# Altium footprint library RPSLib.PcbLib: 116 footprints (part 3 of 8)
Each footprint in its own frame and in the unit in brackets; x right, y up, seen from the top. Pads: shape width x height; smd on the part's side, far side on the other; paste and mask are expansions set on the pad; w line width, h text height; cw(c..) or ccw(c..) is an arc to the next point about the centre after c.
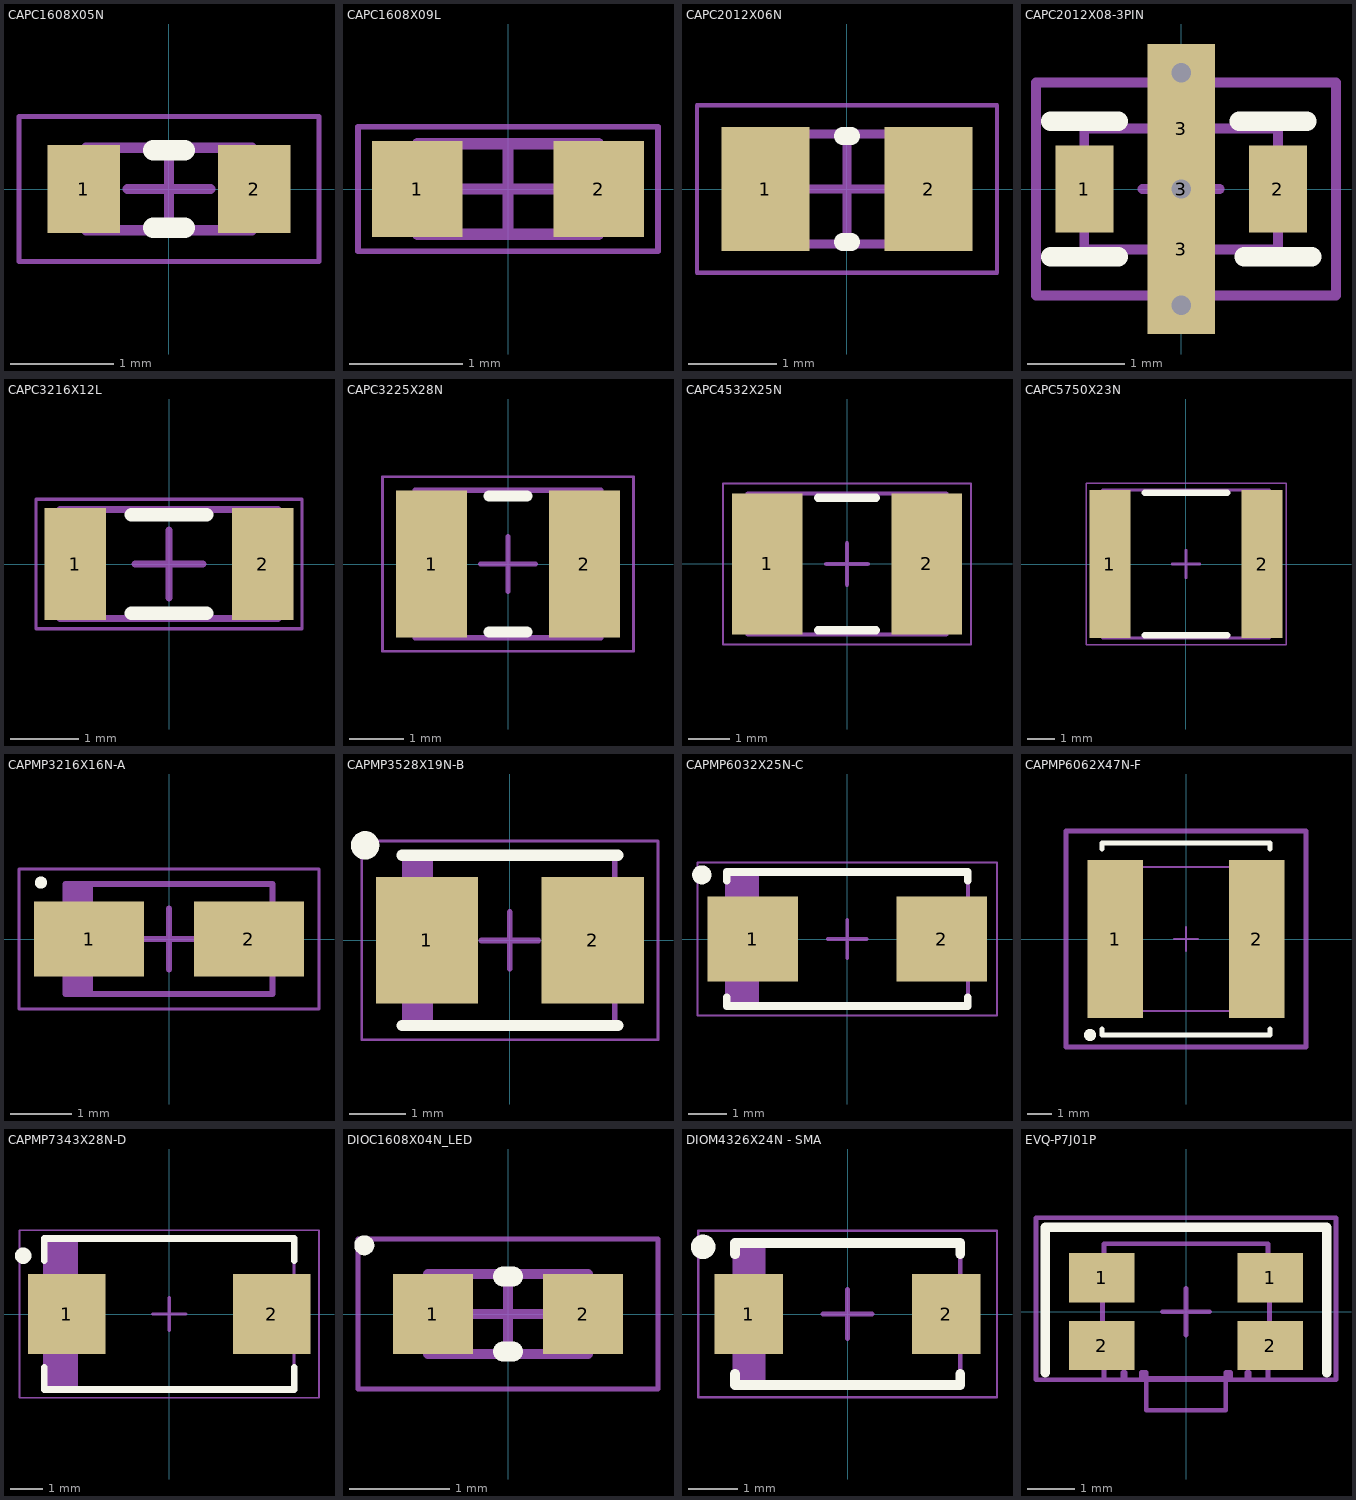
[diagram p2: the footprints below, top view; thin cyan lines are the x and y axes]

## CAPC1608X05N [mm] "Chip Capacitor, 2-Leads, Body 1.60x0.80mm, IPC Medium Density"
height 0.5
pads (2):
  rect 0.7x0.85 smd paste-0.05: 1(-0.825,0) 2(0.825,0)
Top Overlay:
  lines w0.2: -0.15,-0.375 0.15,-0.375 ; -0.15,0.375 0.15,0.375
Mechanical 13:
  lines w0.1: -0.8,-0.4 0.8,-0.4 0.8,0.4 -0.8,0.4 -0.8,-0.4
Mechanical 15:
  lines w0.05: -1.45,-0.7 -1.45,0.7 1.45,0.7 1.45,-0.7 -1.45,-0.7
  lines w0.1: -0.4,0 0.4,0 ; 0,-0.4 0,0.4
3D body "CAPC1608X05N.step": height 0.5, standoff 0, extent -0.8,-0.4 0.8,0.4

## CAPC1608X09L [mm] "Chip Capacitor, 2-Leads, Body 1.60x0.80mm, IPC High Density"
height 0.9
pads (2):
  rect 0.8x0.85 smd paste-0.05 mask+0.07: 1(-0.8,0) 2(0.8,0)
Mechanical 13:
  lines w0.1: -0.8,-0.4 -0.8,0.4 0.8,0.4 0.8,-0.4 -0.8,-0.4
Mechanical 15:
  lines w0.05: -1.325,-0.55 -1.325,0.55 1.325,0.55 1.325,-0.55 -1.325,-0.55
  lines w0.1: -0.4,0 0.4,0 ; 0,-0.4 0,0.4
3D body "CAPC1608X09L.step": height 0.9, standoff 0, extent -0.8,-0.4 0.8,0.4

## CAPC2012X06N [mm] "Chip Capacitor, 2-Leads, Body 2.00x1.25mm, IPC Medium Density"
height 0.6
pads (2):
  rect 1x1.4 smd: 1(-0.925,0) 2(0.925,0)
Top Overlay:
  lines w0.2: -0.05,-0.6 0.05,-0.6 ; -0.05,0.6 0.05,0.6
Mechanical 13:
  lines w0.1: -1,-0.625 1,-0.625 1,0.625 -1,0.625 -1,-0.625
Mechanical 15:
  lines w0.05: -1.7,-0.95 1.7,-0.95 1.7,0.95 -1.7,0.95 -1.7,-0.95
  lines w0.1: -0.5,0 0.5,0 ; 0,-0.5 0,0.5
3D body "CAPC2012X06N.step": height 0.6, standoff 0, extent -1,-0.625 1,0.625

## CAPC2012X08-3PIN [mm]
height 0.8
pads (5):
  rect 0.6x0.9 smd paste-0.02 mask+0.07: 1(-1,0) 2(1,0)
  rect 0.7x0.65 smd paste-0.02 mask+0.07: 3(0,-0.625) 3(0,0.625)
  rect 0.7x3 smd paste-1: 3(0,0)
via 0,0 diameter 0.4 hole 0.2
via 0,1.2 diameter 0.4 hole 0.2
via 0,-1.2 diameter 0.4 hole 0.2
Top Overlay:
  lines w0.2: -1.35,-0.7 -0.65,-0.7 ; -1.35,0.7 -0.65,0.7 ; 0.6,0.7 1.3,0.7 ; 0.65,-0.7 1.35,-0.7
Mechanical 13:
  lines w0.1: -1,-0.625 1,-0.625 1,0.625 -1,0.625 -1,-0.625
Mechanical 15:
  lines w0.1: -0.4,0 0.4,0 ; 0,-0.4 0,0.4 ; -1.5,-1.1 1.6,-1.1 1.6,1.1 -1.5,1.1 -1.5,-1.1
3D body "User Library-EMIFIL_0805.step": height 0.86, standoff 0.01, extent -1,-0.625 1,0.625

## CAPC3216X12L [mm] "Chip Capacitor, 2-Leads, Body 3.20x1.60mm, IPC High Density"
height 1.25
pads (2):
  rect 0.9x1.65 smd paste-0.05 mask+0.07: 1(-1.375,0) 2(1.375,0)
Top Overlay:
  lines w0.2: -0.55,-0.725 0.55,-0.725 ; -0.55,0.725 0.55,0.725
Mechanical 13:
  lines w0.1: -1.6,-0.8 -1.6,0.8 1.6,0.8 1.6,-0.8 -1.6,-0.8
Mechanical 15:
  lines w0.05: -1.95,-0.95 -1.95,0.95 1.95,0.95 1.95,-0.95 -1.95,-0.95
  lines w0.1: -0.5,0 0.5,0 ; 0,-0.5 0,0.5
3D body "CAPC3216X12L.step": height 1.25, standoff 0, extent -1.6,-0.8 1.6,0.8

## CAPC3225X28N [mm] "Chip Capacitor, 2-Leads, Body 3.20x2.50mm, IPC Medium Density"
height 2.79
pads (2):
  rect 1.3x2.7 smd: 1(-1.4,0) 2(1.4,0)
Top Overlay:
  lines w0.2: -0.35,-1.25 0.35,-1.25 ; -0.35,1.25 0.35,1.25
Mechanical 13:
  lines w0.1: -1.7,-1.35 -1.7,1.35 1.7,1.35 1.7,-1.35 -1.7,-1.35
Mechanical 15:
  lines w0.05: -2.3,-1.6 -2.3,1.6 2.3,1.6 2.3,-1.6 -2.3,-1.6
  lines w0.1: -0.5,0 0.5,0 ; 0,-0.5 0,0.5
3D body "CAPC3225X28N.step": height 2.79, standoff 0, extent -1.7,-1.35 1.7,1.35

## CAPC4532X25N [mm] "Chip Capacitor, 2-Leads, Body 4.50x3.20mm, IPC Medium Density"
height 2.54
pads (2):
  rect 1.7x3.4 smd paste-0.06 mask+0.07: 1(-1.925,0) 2(1.925,0)
Top Overlay:
  lines w0.2: -0.7,-1.6 0.7,-1.6 ; -0.7,1.6 0.7,1.6
Mechanical 13:
  lines w0.1: -2.4,-1.7 2.4,-1.7 2.4,1.7 -2.4,1.7 -2.4,-1.7
Mechanical 15:
  lines w0.05: -3,-1.95 3,-1.95 3,1.95 -3,1.95 -3,-1.95
  lines w0.1: -0.5,0 0.5,0 ; 0,-0.5 0,0.5
3D body "CAPC4532X25N.step": height 2.54, standoff 0, extent -2.4,-1.7 2.4,1.7

## CAPC5750X23N [mm] "Chip Capacitor, 2-Leads, Body 5.70x5.00mm, IPC Medium Density"
height 2.3
pads (2):
  rect 1.5x5.4 smd paste-0.05 mask+0.07: 1(-2.775,0) 2(2.775,0)
Top Overlay:
  lines w0.25: -1.5,-2.6 1.5,-2.6 ; -1.5,2.6 1.5,2.6
Mechanical 13:
  lines w0.1: -3.05,-2.7 3.05,-2.7 3.05,2.7 -3.05,2.7 -3.05,-2.7
Mechanical 15:
  lines w0.05: -3.65,-2.95 3.65,-2.95 3.65,2.95 -3.65,2.95 -3.65,-2.95
  lines w0.1: -0.5,0 0.5,0 ; 0,-0.5 0,0.5
3D body "CAPC5750X23N.step": height 2.3, standoff 0, extent -3.05,-2.7 3.05,2.7

## CAPMP3216X16N-A [mm] "Molded Capacitor, 2-Leads, Body 3.20x1.60mm, IPC Medium Density"
height 1.6
pads (2):
  rect 1.8x1.23 smd: 1(-1.31,0) 2(1.31,0)
Top Overlay:
  circle w0.1: c-2.1,0.925 r0.05
Mechanical 13:
  rectangle: -1.7,-0.9 -1.243,0.9
  lines w0.1: -1.7,-0.9 1.7,-0.9 1.7,0.9 -1.7,0.9 -1.7,-0.9
Mechanical 15:
  lines w0.05: -2.46,-1.15 -2.46,1.15 2.46,1.15 2.46,-1.15 -2.46,-1.15
  lines w0.1: -0.5,0 0.5,0 ; 0,-0.5 0,0.5
3D body "CAPMP3216X16N.step": height 1.6, standoff 0, extent -1.92,-0.9 1.92,0.9

## CAPMP3528X19N-B [mm] "Molded Capacitor, 2-Leads, Body 3.50x2.80mm, IPC Medium Density"
height 1.9
pads (2):
  rect 1.8x2.23 smd: 1(-1.46,0) 2(1.46,0)
Top Overlay:
  circle w0.25: c-2.55,1.675 r0.125
  lines w0.2: -1.9,-1.5 1.9,-1.5 ; -1.9,1.5 1.9,1.5
Mechanical 13:
  rectangle: -1.85,-1.5 -1.352,1.5
  lines w0.1: -1.85,-1.5 -1.85,1.5 1.85,1.5 1.85,-1.5 -1.85,-1.5
Mechanical 15:
  lines w0.05: -2.61,-1.75 2.61,-1.75 2.61,1.75 -2.61,1.75 -2.61,-1.75
  lines w0.1: -0.5,0 0.5,0 ; 0,-0.5 0,0.5
3D body "CAPMP3528X19N.step": height 1.9, standoff 0, extent -2.07,-1.5 2.07,1.5

## CAPMP6032X25N-C [mm] "Molded Capacitor, 2-Leads, Body 6.00x3.20mm, IPC Medium Density"
height 2.5
pads (2):
  rect 2.37x2.23 smd: 1(-2.47,0) 2(2.47,0)
Top Overlay:
  circle w0.25: c-3.8,1.675 r0.125
  lines w0.2: -3.15,-1.525 -3.15,-1.75 3.15,-1.75 3.15,-1.525 ; -3.15,1.525 -3.15,1.75 3.15,1.75 3.15,1.525
Mechanical 13:
  rectangle: -3.15,-1.75 -2.303,1.75
  lines w0.1: -3.15,-1.75 3.15,-1.75 3.15,1.75 -3.15,1.75 -3.15,-1.75
Mechanical 15:
  lines w0.05: -3.91,-2 -3.91,2 3.91,2 3.91,-2 -3.91,-2
  lines w0.1: -0.5,0 0.5,0 ; 0,-0.5 0,0.5
3D body "CAPMP6032X25N.step": height 2.5, standoff 0, extent -3.37,-1.75 3.37,1.75

## CAPMP6062X47N-F [mm] "Molded Capacitor, 2-Leads, Body 6.00x6.20mm, IPC Medium Density"
height 4.7
pads (2):
  rect 2.3x6.6 smd: 1(-2.95,0) 2(2.95,0)
Top Overlay:
  circle w0.25: c-4,-4 r0.125
  lines w0.2: -3.5,-3.75 -3.5,-4 3.5,-4 3.5,-3.75 ; -3.5,3.75 -3.5,4 3.5,4 3.5,3.75
Mechanical 13:
  lines w0.1: -3.1,-3 -3.1,3 3.1,3 3.1,-3 -3.1,-3
Mechanical 15:
  lines w0.1: -0.5,0 0.5,0 ; 0,-0.5 0,0.5
  lines w0.2: -5,-4.5 -5,4.5 5,4.5 5,-4.5 -5,-4.5
3D body: height 4.7, standoff 0.1, extent -3.1,-3 3.1,3

## CAPMP7343X28N-D [mm] "Molded Capacitor, 2-Leads, Body 7.30x4.30mm, IPC Medium Density"
height 2.8
pads (2):
  rect 2.37x2.43 smd: 1(-3.12,0) 2(3.12,0)
Top Overlay:
  circle w0.25: c-4.45,1.775 r0.125
  lines w0.2: -3.8,-1.625 -3.8,-2.3 3.8,-2.3 3.8,-1.625 ; -3.8,1.625 -3.8,2.3 3.8,2.3 3.8,1.625
Mechanical 13:
  rectangle: -3.8,-2.3 -2.778,2.3
  lines w0.1: -3.8,-2.3 -3.8,2.3 3.8,2.3 3.8,-2.3 -3.8,-2.3
Mechanical 15:
  lines w0.05: -4.56,-2.55 -4.56,2.55 4.56,2.55 4.56,-2.55 -4.56,-2.55
  lines w0.1: -0.5,0 0.5,0 ; 0,-0.5 0,0.5
3D body "CAPMP7343X28N.step": height 2.8, standoff 0, extent -4.02,-2.3 4.02,2.3

## DIOC1608X04N_LED [mm] "Chip LED, 2-Leads, Body 1,60x0,80mm, IPC Medium Density"
height 0.35
pads (2):
  rect 0.8x0.8 smd: 1(-0.75,0) 2(0.75,0)
Top Overlay:
  circle w0.1: c-1.437,0.687 r0.05
  lines w0.2: -0.05,-0.375 0.05,-0.375 ; -0.05,0.375 0.05,0.375
Mechanical 13:
  lines w0.1: -0.8,-0.4 0.8,-0.4 0.8,0.4 -0.8,0.4 -0.8,-0.4
Mechanical 15:
  lines w0.05: -1.5,-0.75 1.5,-0.75 1.5,0.75 -1.5,0.75 -1.5,-0.75
  lines w0.1: -0.4,0 0.4,0 ; 0,-0.4 0,0.4
3D body "LTST-C193KGKT-5A.stp": height 0.35, standoff 0, extent -0.81,-0.4 0.81,0.4

## DIOM4326X24N - SMA [mm] "Molded Diode, 2-Leads, Body 4,28x2,58mm, IPC Medium Density"
height 2.45
pads (2):
  rect 1.4x1.64 smd: 1(-2.015,0) 2(2.015,0)
Top Overlay:
  circle w0.25: c-2.95,1.37 r0.125
  lines w0.2: -2.3,-1.22 -2.3,-1.45 2.3,-1.45 2.3,-1.22 ; -2.3,1.22 -2.3,1.45 2.3,1.45 2.3,1.22
Mechanical 13:
  rectangle: -2.3,-1.45 -1.681,1.45
  lines w0.1: -2.3,-1.45 2.3,-1.45 2.3,1.45 -2.3,1.45 -2.3,-1.45
Mechanical 15:
  lines w0.05: -3.05,-1.7 3.05,-1.7 3.05,1.7 -3.05,1.7 -3.05,-1.7
  lines w0.1: -0.5,0 0.5,0 ; 0,-0.5 0,0.5
3D body "DIOM4326X24N - SMA.step": height 2.45, standoff 0, extent -2.52,-1.45 2.52,1.45

## EVQ-P7J01P [mm] "Tactile switch"
height 1.35
pads (4):
  rect 1.4x1.05 smd: 1(-1.8,0.725) 1(1.8,0.725) 2(-1.8,-0.725) 2(1.8,-0.725)
Top Overlay:
  lines w0.2: -3,-1.3 -3,1.8 3,1.8 3,-1.3
Mechanical 13:
  lines w0.1: -1.78,-0.43 -2.1,-0.43 -2.1,-0.45 cw(c-2.2,-0.45) -2.2,-0.55 -2.35,-0.55 -2.35,-1.05 -1.75,-1.05 -1.75,-0.45 -1.78,-0.45 -1.78,0.45 -1.75,0.45 -1.75,1.05 -2.35,1.05 -2.35,0.55 -2.2,0.55 cw(c-2.2,0.45) -2.1,0.45 -2.1,0.43 -1.78,0.43 ; -1.75,-0.475 -1.75,-1.3 -1.75,-1.45 -1.35,-1.45 -1.35,-1.3 -1.3,-1.3 -1.3,-1.45 -0.95,-1.45 -0.95,-1.3 -0.85,-1.3 -0.85,-1.55 -0.85,-2.1 -0.25,-2.1 ; -1.75,0.475 -1.75,1.3 -1.75,1.45 -1.35,1.45 ; -1.7,1.45 -1.3,1.45 0,1.45 1.3,1.45 1.7,1.45 ; -0.85,-1.425 0.85,-1.425 ; -0.2,-2.1 -0.25,-2.1 ; 0.2,-2.1 0.25,-2.1 ; 1.35,1.45 1.75,1.45 1.75,1.3 1.75,0.475 ; 1.75,-0.475 1.75,-1.3 1.75,-1.45 1.35,-1.45 1.35,-1.3 1.3,-1.3 1.3,-1.45 0.95,-1.45 0.95,-1.3 0.85,-1.3 0.85,-1.55 0.85,-2.1 0.25,-2.1 ; 1.78,-0.43 2.1,-0.43 2.1,-0.45 ccw(c2.2,-0.45) 2.2,-0.55 2.35,-0.55 2.35,-1.05 1.75,-1.05 1.75,-0.45 1.78,-0.45 1.78,0.45 1.75,0.45 1.75,1.05 2.35,1.05 2.35,0.55 2.2,0.55 ccw(c2.2,0.45) 2.1,0.45 2.1,0.43 1.78,0.43 ; -0.25,-2.1 0,-2.1 0.25,-2.1
Mechanical 15:
  lines w0.1: -0.5,0 0.5,0 ; 0,-0.5 0,0.5 ; -3.2,-1.45 -3.2,2 3.2,2 3.2,-1.45 -3.2,-1.45
3D body "EVQ-P7J01P.stp": height 1.35, standoff 0, extent -2.35,-2.1 2.35,1.45